# Altium schematic symbol library Altium_Lib.SchLib: 403 symbols (part 3 of 4) (continued)
## STM32F030C8T6_XX (continued)

## STM32F030K6T6
designator U?
IC MCU 32BIT 32KB FLASH 32LQFP; Manufacturer: STMicroelectronics; Oscillator Type: Internal; Data Converters: A/D 12x12b; Voltage - Supply (Vcc/Vdd): 2.4 V ~ 3.6 V; Peripherals: DMA, POR, PWM, WDT; RAM Size: 4K x 8; Program Memory Size: 32KB (32K x 8); Number of I/O: 26; Connectivity: I²C, SPI, UART/USART; Speed: 48MHz; Core Size: 32-Bit; Core Processor: ARM® Cortex®-M0; Supplier 1: Digi-Key; Supplier Device Package: 32-LQFP (7x7); Package / Case: 32-LQFP; Operating Temperature: -40°C ~ 85°C (TA); Program Memory Type: FLASH; EEPROM Size: -; Supplier: Digi-Key; RoHS: RoHS Compliant; Part Status: Active; Packaging: Tray; Category: Integrated Circuits (ICs); Manufacturer Part Number: STM32F030K6T6; ComponentLink1URL: http://www.st.com/content/ccc/resource/technical/document/datasheet/a4/5d/0b/0e/87/c4/4d/71/DM00088500.pdf/files/DM00088500.pdf/jcr:content/translations/en.DM00088500.pdf; ComponentLink1Description: http://www.st.com/content/ccc/resource/technical/document/datasheet/a4/5d/0b/0e/87/c4/4d/71/DM00088500.pdf/files/DM00088500.pdf/jcr:content/translations/en.DM00088500.pdf; Pricing: 1=1.48, 10=1.328, 100=1.0671, 500=0.87676, 1000=0.72645 (USD); Supplier Part Number: 497-14046-ND; Mounting Type: Surface Mount
footprint LQFP-32
pins: 1 VDD, 2 PF0-OSC_IN, 3 PF1-OSC_OUT, 4 NRST, 5 VDDA, 6 PA0, 7 PA1, 8 PA2, 9 PA3, 10 PA4, 11 PA5, 12 PA6, 13 PA7, 14 PB0, 15 PB1, 16 VSS, 17 VDD, 18 PA8, 19 PA9/USART1_TX, 20 PA10/USART1_RX, 21 PA11, 22 PA12, 23 PA13/SWDIO, 24 PA14/SWCLK, 25 PA15, 26 PB3, 27 PB4, 28 PB5, 29 PB6, 30 PB7, 31 BOOT0, 32 VSS

## STM32F072CB
designator U?, comment STM32F072CBT6
IC MCU 32BIT 128KB FLASH 48LQFP; Manufacturer: STMicroelectronics; Connectivity: CAN, HDMI-CEC, I²C, IrDA, LIN, SPI, UART/USART, USB; Core Processor: ARM® Cortex®-M0; Core Size: 32-Bit; Data Converters: A/D 10x12b, D/A 2x12b; Number of I/O: 37; Oscillator Type: Internal; Peripherals: DMA, I²S, POR, PWM, WDT; Program Memory Size: 128KB (128K x 8); RAM Size: 16K x 8; Speed: 48MHz; Voltage - Supply (Vcc/Vdd): 1.65 V ~ 3.6 V; Category: Integrated Circuits (ICs); EEPROM Size: -; Manufacturer Part Number: STM32F072CBT6; Operating Temperature: -40°C ~ 85°C (TA); Package / Case: 48-LQFP; Packaging: Tray; Part Status: Active; Program Memory Type: FLASH; RoHS: RoHS Compliant; Supplier: Digi-Key; Supplier Device Package: 48-LQFP (7x7); ComponentLink1URL: http://www.st.com/content/ccc/resource/technical/document/datasheet/cd/46/43/83/22/d3/40/c8/DM00090510.pdf/files/DM00090510.pdf/jcr:content/translations/en.DM00090510.pdf; ComponentLink1Description: http://www.st.com/content/ccc/resource/technical/document/datasheet/cd/46/43/83/22/d3/40/c8/DM00090510.pdf/files/DM00090510.pdf/jcr:content/translations/en.DM00090510.pdf; Pricing: 1=3.56, 10=3.196, 100=2.6189, 500=2.22938, 1000=1.8802 (USD); Supplier Part Number: 497-14645-ND; Mounting Type: Surface Mount
footprint LQFP-48-7x7 (hin QFP, 48-Leads, Body 7x7mm, Pitch 0.5mm, IPC Medium Density)
pins: 1 VBAT (power), 2 PC13 (io), 3 PC14/OSC32_IN (io), 4 PC15/OSC32_OUT (io), 5 PF0/OSC_IN (io), 6 PF1/OSC_OUT (io), 7 NRST (io), 8 VSSA (power), 9 VDDA (power), 10 PA0 (io), 11 PA1 (io), 12 PA2 (io), 13 PA3 (io), 14 PA4 (io), 15 PA5 (io), 16 PA6 (io), 17 PA7 (io), 18 PB0 (io), 19 PB1 (io), 20 PB2 (io), 21 PB10 (io), 22 PB11 (io), 23 VSS (power), 24 VDD (power), 25 PB12 (io), 26 PB13 (io), 27 PB14 (io), 28 PB15 (io), 29 PA8 (io), 30 PA9 (io), 31 PA10 (io), 32 PA11 (io), 33 PA12 (io), 34 PA13/SWDIO (io), 35 VSS (power), 36 VDDIO2 (power), 37 PA14/SWCLK (io), 38 PA15 (io), 39 PB3 (io), 40 PB4 (io), 41 PB5 (io), 42 PB6 (io), 43 PB7 (io), 44 BOOT0 (io), 45 PB8 (io), 46 PB9 (io), 47 VSS (power), 48 VDD (power)

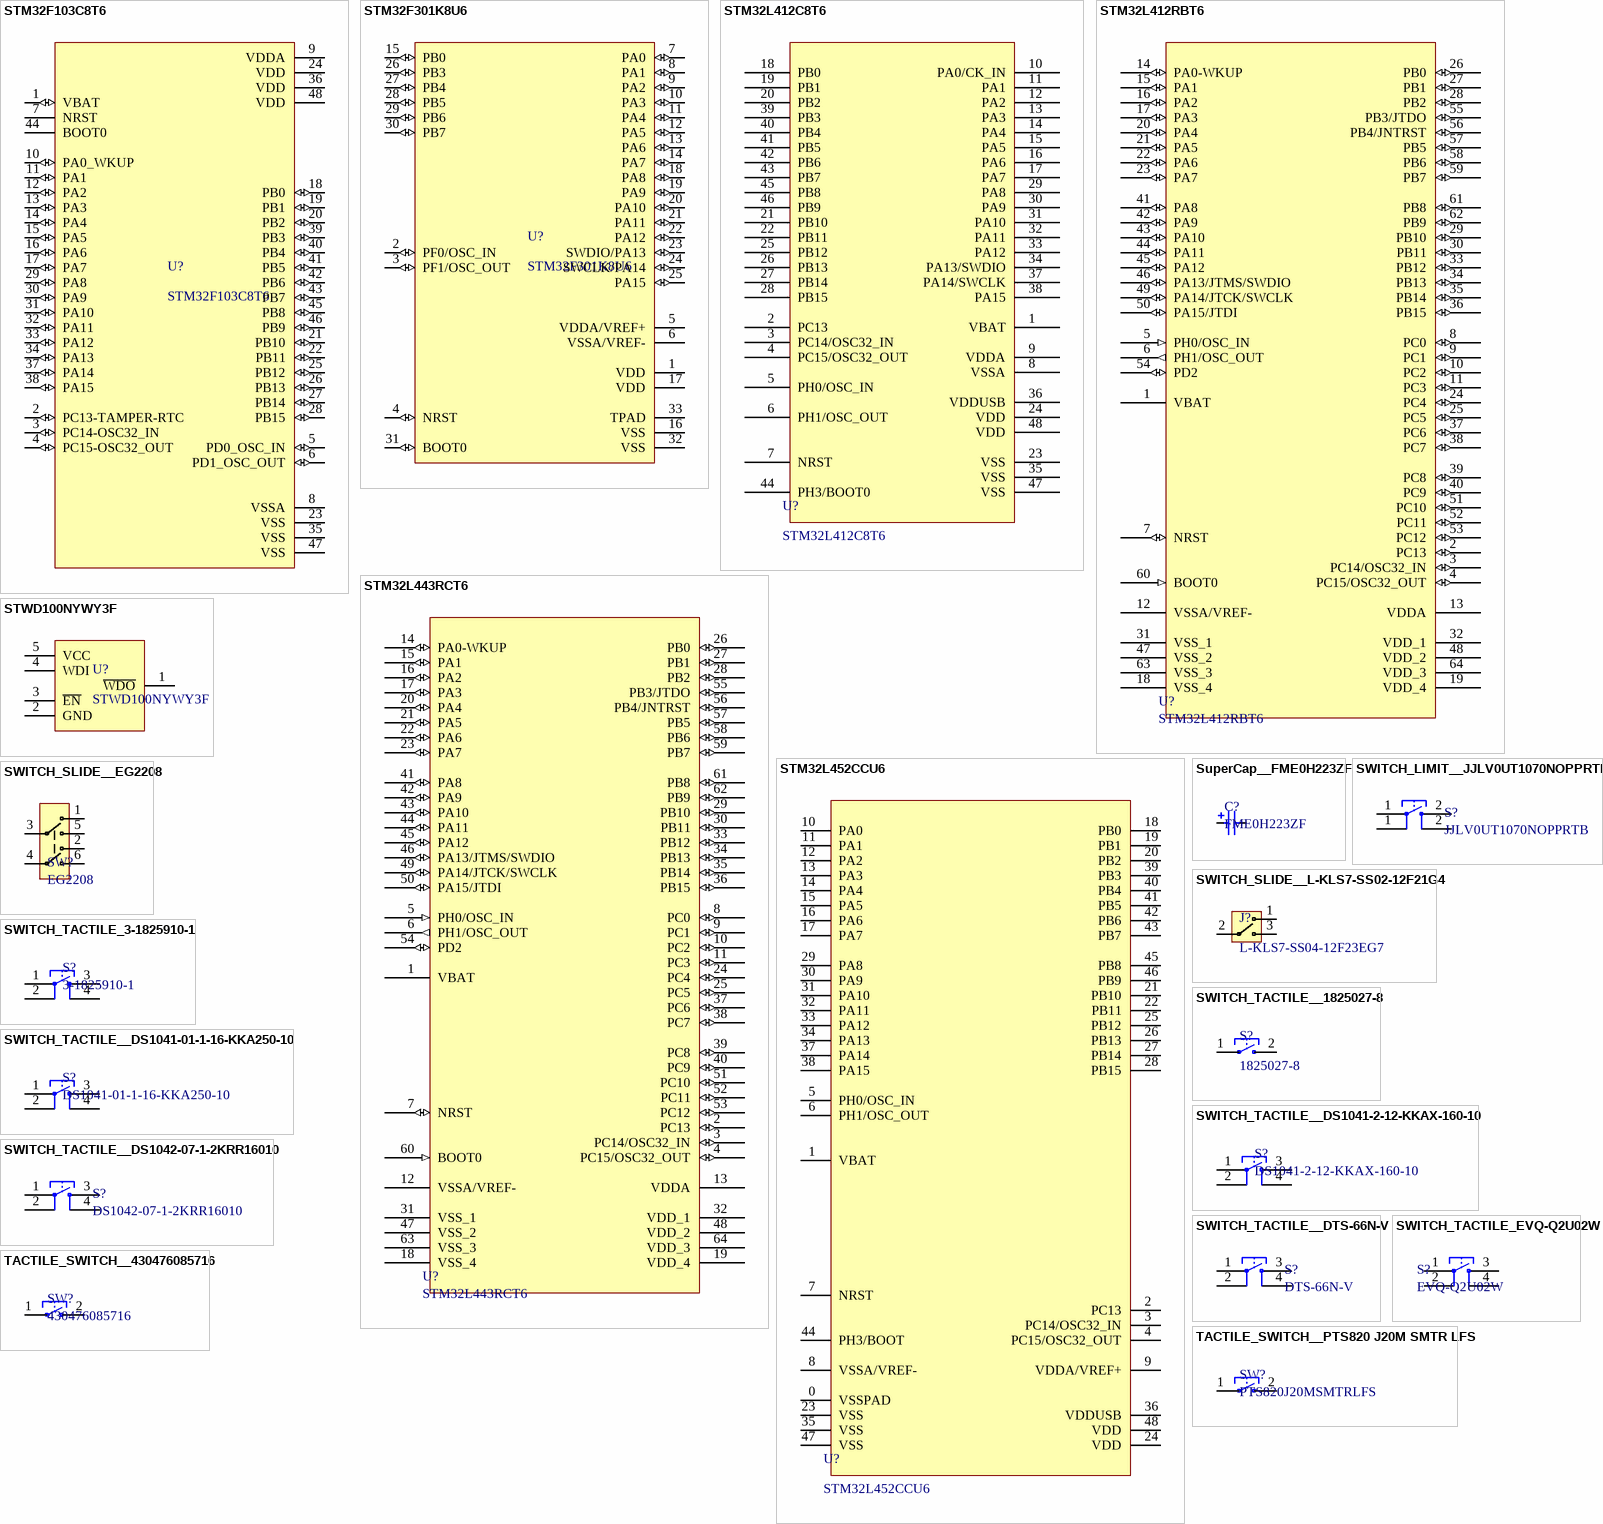
[diagram p9: symbols STM32F103C8T6 to TACTILE_SWITCH__PTS820 J20M SMTR LFS]

## STM32F103C8T6
designator U?
IC MCU 32-Bit 72MHz 64kB FLASH LQFP48; MF: STMicroelectronics; RAM Size: 20KB; Max Power Dissipation: 363mW; Interface: I2C,SPI,USB,CAN,IrDA,UART,USART,LIN; Number of I/Os: 37; Number of Timers/Counters: 4; Max Supply Voltage: 3.6V; Number of ADC Channels: 10; Min Supply Voltage: 2V; Oscillator Type: Internal; Number of Programmable I/O: 48; Data Bus Width: 32b; Number of Bits: 32; Watchdog Timer: Yes; Peripherals: POR,PWM,WDT,DMA,Temp Sensor,I2C; Core Architecture: ARM; Number of PWM Channels: 1; Number of SPI Channels: 2; Price: None; Package: LQFP-48 STMicroelectronics; Value: *; MP: STM32F103C8T6; Availability: Unavailable; Supplier 1: Digi-Key; Manufacturer: STMicroelectronics; Manufacturer Part Number: STM32F103C8T6; RoHS: Yes; Category: Microcontrollers; Pricing 1: 1=7,00000, 10=6,28800, 25=5,94440, 80=5,15175, 250=4,88756, 500=4,40320 (USD); Case/Package: LQFP; Number of Pins: 48; Min Operating Temperature: -40°C; Max Operating Temperature: 85°C; Frequency: 72MHz; Packaging: Tray; Package Quantity: 250; Density: 64KB; Memory Type: FLASH; Max Frequency: 72MHz; Memory Size: 64KB; Termination: SMD/SMT; Number of I2C Channels: 2; Address Bus Width: 32b; Length: 7mm; Width: 7.2mm; Height: 1.45mm; Radiation Hardening: No; Lead Free: Lead Free; REACH SVHC: No SVHC; ComponentLink1URL: https://datasheet.ciiva.com/15122/getdatasheetpartid-69880-15122076.pdf?src-supplier=Verical; ComponentLink1Description: https://datasheet.ciiva.com/15122/getdatasheetpartid-69880-15122076.pdf?src-supplier=Verical; ComponentLink2URL: https://datasheet.ciiva.com/26816/stm32f103c8t6-26816902.pdf?src-supplier=IIIC; ComponentLink2Description: https://datasheet.ciiva.com/26816/stm32f103c8t6-26816902.pdf?src-supplier=IIIC; ComponentLink3URL: https://datasheet.ciiva.com/16210/cd00161566-16210248.pdf?src-supplier=Future+Electronics; ComponentLink3Description: https://datasheet.ciiva.com/16210/cd00161566-16210248.pdf?src-supplier=Future+Electronics; ComponentLink4URL: https://datasheet.ciiva.com/14100/pustm-arm-microcont-stm32f103-en-14100508.pdf?src-supplier=Distrelec; ComponentLink4Description: https://datasheet.ciiva.com/14100/pustm-arm-microcont-stm32f103-en-14100508.pdf?src-supplier=Distrelec; ComponentLink5URL: https://datasheet.ciiva.com/8054/1730126-8054942.pdf?src-supplier=Element14; ComponentLink5Description: https://datasheet.ciiva.com/8054/1730126-8054942.pdf?src-supplier=Element14; ComponentLink6URL: https://datasheet.ciiva.com/48687/001075658-da-01-en-mcu-64kb-mem-stm32f103c8t6-lqfp-48-stm-48687589.pdf?src-supplier=Conrad; ComponentLink6Description: https://datasheet.ciiva.com/48687/001075658-da-01-en-mcu-64kb-mem-stm32f103c8t6-lqfp-48-stm-48687589.pdf?src-supplier=Conrad; Supplier Part Number 1: 497-6063-ND
footprint QFN48-(7mmX7mm) (QFN, 48-Leads, Body 7,1x7,1mm (max), Pitch 0,50mm, IPC Medium Density)
pins: 1 VBAT (io), 2 PC13-TAMPER-RTC (io), 3 PC14-OSC32_IN (io), 4 PC15-OSC32_OUT (io), 5 PD0_OSC_IN (io), 6 PD1_OSC_OUT (io), 7 NRST, 8 VSSA, 9 VDDA, 10 PA0_WKUP (io), 11 PA1 (io), 12 PA2 (io), 13 PA3 (io), 14 PA4 (io), 15 PA5 (io), 16 PA6 (io), 17 PA7 (io), 18 PB0 (io), 19 PB1 (io), 20 PB2 (io), 21 PB10 (io), 22 PB11 (io), 23 VSS, 24 VDD, 25 PB12 (io), 26 PB13 (io), 27 PB14 (io), 28 PB15 (io), 29 PA8 (io), 30 PA9 (io), 31 PA10 (io), 32 PA11 (io), 33 PA12 (io), 34 PA13 (io), 35 VSS, 36 VDD, 37 PA14 (io), 38 PA15 (io), 39 PB3 (io), 40 PB4 (io), 41 PB5 (io), 42 PB6 (io), 43 PB7 (io), 44 BOOT0, 45 PB8 (io), 46 PB9 (io), 47 VSS, 48 VDD

## STM32F301K8U6
designator U?
ARM Microcontrollers - MCU Mainstream Mixed signals MCUs ARM Cortex-M4 core with DSP and FPU, 64 Kbytes Flash, 72 MHz CPU, 12-bit ADC 5 MSPS, Comparator, Op-Amp; Manufacturer: STMicroelectronics; Processor Series: ARM Cortex M; Supplier 1: Mouser; Manufacturer Part Number: STM32F301K8U6; RoHS: RoHS Compliant; Category: ARM Microcontrollers - MCU; Stock 1: 2435; Pricing 1: 1=2.89, 10=2.46, 100=1.97, 500=1.72, 1000=1.43, 2500=1.33, 5000=1.28 (USD); Series: STM32F301K8; Brand: STMicroelectronics; Standard Pack Qty: 2940; Tradename: STM32; RoHS - Mouser: Y; Minimum Order Quantity: 1; Reeling: False; ComponentLink1URL: https://www.mouser.com/datasheet/2/389/stm32f301c6-956213.pdf; ComponentLink1Description: https://www.mouser.com/datasheet/2/389/stm32f301c6-956213.pdf; Supplier Part Number 1: 511-STM32F301K8U6
footprint UFQFPN32__50P500X500X60-33N
pins: 1 VDD (power), 2 PF0/OSC_IN (io), 3 PF1/OSC_OUT (io), 4 NRST (io), 5 VDDA/VREF+ (power), 6 VSSA/VREF- (power), 7 PA0 (io), 8 PA1 (io), 9 PA2 (io), 10 PA3 (io), 11 PA4 (io), 12 PA5 (io), 13 PA6 (io), 14 PA7 (io), 15 PB0 (io), 16 VSS (power), 17 VDD (power), 18 PA8 (io), 19 PA9 (io), 20 PA10 (io), 21 PA11 (io), 22 PA12 (io), 23 SWDIO/PA13 (io), 24 SWCLK/PA14 (io), 25 PA15 (io), 26 PB3 (io), 27 PB4 (io), 28 PB5 (io), 29 PB6 (io), 30 PB7 (io), 31 BOOT0 (io), 32 VSS (power), 33 TPAD (power)

## STM32L412C8T6
designator U?
ARM Microcontrollers - MCU 16/32-BITS MICROS; Manufacturer: STMicroelectronics; Program Memory Type: Flash; Data RAM Size: 40 kB; Data RAM Type: SRAM; Interface Type: CAN, I2C, SPI, UART, USART, USB; Program Memory Size: 64 kB; ADC Resolution: 12 bit; Analog Supply Voltage: 1.62 V to 3.6 V; Core: ARM Cortex M4; Data Bus Width: 32 bit; Maximum Clock Frequency: 80 MHz; Number of ADC Channels: 12 Channel; Operating Supply Voltage: 1.71 V to 3.6 V; Supply Voltage - Max: 3.6 V; Supply Voltage - Min: 1.71 V; Watchdog Timers: Watchdog Timer, Windowed; Product Status: New Product; Supplier 1: Mouser; Manufacturer Part Number: STM32L412C8T6; RoHS: RoHS Compliant; Category: ARM Microcontrollers - MCU; Stock 1: 1088; Pricing 1: 1=3.59, 10=3.05, 100=2.64, 250=2.50, 500=2.25, 1000=2.00, 2500=1.80, 5000=1.73 (USD); Package / Case: LQFP-48; Product: MCU+FPU; Series: STM32L412C8; Brand: STMicroelectronics; Mounting Style: SMD/SMT; Maximum Operating Temperature: + 85 C; Minimum Operating Temperature: - 40 C; Moisture Sensitive: Yes; Product Type: ARM Microcontrollers - MCU; Standard Pack Qty: 1500; Subcategory: Microcontrollers - MCU; Tradename: ARM; RoHS - Mouser: Y; Minimum Order Quantity: 1; Reeling: False; ComponentLink1URL: https://www.mouser.com/datasheet/2/389/stm32l412cb-1831850.pdf; ComponentLink1Description: https://www.mouser.com/datasheet/2/389/stm32l412cb-1831850.pdf; Supplier Part Number 1: 511-STM32L412C8T6
footprint LQFP-48-7x7 (hin QFP, 48-Leads, Body 7x7mm, Pitch 0.5mm, IPC Medium Density)
pins: 1 VBAT, 2 PC13, 3 PC14/OSC32_IN, 4 PC15/OSC32_OUT, 5 PH0/OSC_IN, 6 PH1/OSC_OUT, 7 NRST, 8 VSSA, 9 VDDA, 10 PA0/CK_IN, 11 PA1, 12 PA2, 13 PA3, 14 PA4, 15 PA5, 16 PA6, 17 PA7, 18 PB0, 19 PB1, 20 PB2, 21 PB10, 22 PB11, 23 VSS, 24 VDD, 25 PB12, 26 PB13, 27 PB14, 28 PB15, 29 PA8, 30 PA9, 31 PA10, 32 PA11, 33 PA12, 34 PA13/SWDIO, 35 VSS, 36 VDDUSB, 37 PA14/SWCLK, 38 PA15, 39 PB3, 40 PB4, 41 PB5, 42 PB6, 43 PB7, 44 PH3/BOOT0, 45 PB8, 46 PB9, 47 VSS, 48 VDD

## STM32L412RBT6
designator U?
Ultra-low-power with FPU Arm Cortex-M4 MCU 80 MHz with 128-Kbyte of Flash memory, USB; Manufacturer: STMicroelectronics; Supplier 1: Avnet; Manufacturer Part Number: STM32L412RBT6; Stock 1: 0; Pricing 1: 960=2.3301, 1920=2.2954, 3840=2.2606, 5760=2.2432, 7680=2.2171, 9600=2.1736, 96000=2.1389 (USD); RoHS Compliant: Yes; ComponentLink1URL: http://www.farnell.com/datasheets/2710915.pdf?src-supplier=Farnell; ComponentLink1Description: http://www.farnell.com/datasheets/2710915.pdf?src-supplier=Farnell; ComponentLink2URL: https://www.st.com/resource/en/datasheet/stm32l412kb.pdf?src-supplier=Digi-Key; ComponentLink2Description: https://www.st.com/resource/en/datasheet/stm32l412kb.pdf?src-supplier=Digi-Key; ComponentLink3URL: http://www.farnell.com/datasheets/2710915.pdf?src-supplier=Newark; ComponentLink3Description: http://www.farnell.com/datasheets/2710915.pdf?src-supplier=Newark; Supplier Part Number 1: STM32L412RBT6
footprint LQFP-64_N
pins: 1 VBAT (power), 2 PC13 (io), 3 PC14/OSC32_IN (io), 4 PC15/OSC32_OUT (io), 5 PH0/OSC_IN (in), 6 PH1/OSC_OUT (out), 7 NRST (io), 8 PC0 (io), 9 PC1 (io), 10 PC2 (io), 11 PC3 (io), 12 VSSA/VREF- (power), 13 VDDA (power), 14 PA0-WKUP (io), 15 PA1 (io), 16 PA2 (io), 17 PA3 (io), 18 VSS_4 (power), 19 VDD_4 (power), 20 PA4 (io), 21 PA5 (io), 22 PA6 (io), 23 PA7 (io), 24 PC4 (io), 25 PC5 (io), 26 PB0 (io), 27 PB1 (io), 28 PB2 (io), 29 PB10 (io), 30 PB11 (io), 31 VSS_1 (power), 32 VDD_1 (power), 33 PB12 (io), 34 PB13 (io), 35 PB14 (io), 36 PB15 (io), 37 PC6 (io), 38 PC7 (io), 39 PC8 (io), 40 PC9 (io), 41 PA8 (io), 42 PA9 (io), 43 PA10 (io), 44 PA11 (io), 45 PA12 (io), 46 PA13/JTMS/SWDIO (io), 47 VSS_2 (power), 48 VDD_2 (power), 49 PA14/JTCK/SWCLK (io), 50 PA15/JTDI (io), 51 PC10 (io), 52 PC11 (io), 53 PC12 (io), 54 PD2 (io), 55 PB3/JTDO (io), 56 PB4/JNTRST (io), 57 PB5 (io), 58 PB6 (io), 59 PB7 (io), 60 BOOT0 (in), 61 PB8 (io), 62 PB9 (io), 63 VSS_3 (power), 64 VDD_3 (power)

## STM32L443RCT6
designator U?
IC MCU 32BIT 256KB FLASH 64LQFP; Manufacturer: STMicroelectronics; Program Memory Size: 256KB (256K x 8); Core Size: 32-Bit; RAM Size: 64K x 8; Connectivity: CANbus, I²C, IrDA, LINbus, MMC/SD, QSPI, SAI, SPI, SWPMI, UART/USART, USB; Data Converters: A/D 16x12b, D/A 2x12b; Voltage - Supply (Vcc/Vdd): 1.71 V ~ 3.6 V; Peripherals: Brown-out Detect/Reset, DMA, LCD, PWM, WDT; Oscillator Type: Internal; Core Processor: ARM® Cortex®-M4; Speed: 80MHz; Program Memory Type: FLASH; RoHS: RoHS Compliant; Packaging: Tray; Manufacturer Part Number: STM32L443RCT6; Supplier: Digi-Key; Category: Integrated Circuits (ICs); Package / Case: 64-LQFP; Supplier Device Package: 64-LQFP (10x10); Part Status: Active; Operating Temperature: -40°C ~ 85°C (TA); EEPROM Size: -; ComponentLink1URL: http://www.st.com/content/ccc/resource/technical/document/datasheet/01/76/9c/b5/c7/d9/40/6c/DM00254865.pdf/files/DM00254865.pdf/jcr:content/translations/en.DM00254865.pdf; ComponentLink1Description: http://www.st.com/content/ccc/resource/technical/document/datasheet/01/76/9c/b5/c7/d9/40/6c/DM00254865.pdf/files/DM00254865.pdf/jcr:content/translations/en.DM00254865.pdf; Pricing: 1=6.49, 10=5.826, 100=4.7736, 960=4.06368, 1920=3.4272 (USD); Supplier Part Number: 497-16589-ND
footprint LQFP-64_N
pins: 1 VBAT (power), 2 PC13 (io), 3 PC14/OSC32_IN (io), 4 PC15/OSC32_OUT (io), 5 PH0/OSC_IN (in), 6 PH1/OSC_OUT (out), 7 NRST (io), 8 PC0 (io), 9 PC1 (io), 10 PC2 (io), 11 PC3 (io), 12 VSSA/VREF- (power), 13 VDDA (power), 14 PA0-WKUP (io), 15 PA1 (io), 16 PA2 (io), 17 PA3 (io), 18 VSS_4 (power), 19 VDD_4 (power), 20 PA4 (io), 21 PA5 (io), 22 PA6 (io), 23 PA7 (io), 24 PC4 (io), 25 PC5 (io), 26 PB0 (io), 27 PB1 (io), 28 PB2 (io), 29 PB10 (io), 30 PB11 (io), 31 VSS_1 (power), 32 VDD_1 (power), 33 PB12 (io), 34 PB13 (io), 35 PB14 (io), 36 PB15 (io), 37 PC6 (io), 38 PC7 (io), 39 PC8 (io), 40 PC9 (io), 41 PA8 (io), 42 PA9 (io), 43 PA10 (io), 44 PA11 (io), 45 PA12 (io), 46 PA13/JTMS/SWDIO (io), 47 VSS_2 (power), 48 VDD_2 (power), 49 PA14/JTCK/SWCLK (io), 50 PA15/JTDI (io), 51 PC10 (io), 52 PC11 (io), 53 PC12 (io), 54 PD2 (io), 55 PB3/JTDO (io), 56 PB4/JNTRST (io), 57 PB5 (io), 58 PB6 (io), 59 PB7 (io), 60 BOOT0 (in), 61 PB8 (io), 62 PB9 (io), 63 VSS_3 (power), 64 VDD_3 (power)

## STM32L452CCU6
designator U?
Ultra-low-power with FPU Arm Cortex-M4 MCU 80 MHz with 256 Kbytes Flash, USB Device, DFSDM; Manufacturer: STMicroelectronics; Interface: I2C,SPI,USB,IrDA,UART,USART; Peripherals: Brown-out Detect/Reset,PWM,WDT,DMA; Frequency: 80MHz; Number of I/Os: 38; Memory Size: 256KB; Oscillator Type: Internal; Supplier 1: Avnet; Manufacturer Part Number: STM32L452CCU6; Stock 1: 0; Pricing 1: 1560=3.3165, 3120=3.2072, 6240=3.1586, 9360=3.1343, 12480=3.0979, 15600=3.0371, 156000=2.9885 (USD); Case/Package: UFQFPN; Min Operating Temperature: -40°C; Max Operating Temperature: 85°C; Memory Type: FLASH; Packaging: Tray; Core Architecture: ARM; ComponentLink1URL: http://www.farnell.com/datasheets/2605257.pdf?src-supplier=Farnell; ComponentLink1Description: http://www.farnell.com/datasheets/2605257.pdf?src-supplier=Farnell; ComponentLink2URL: http://www.st.com/content/ccc/resource/technical/document/datasheet/group3/fc/c2/8d/b7/99/d8/42/9e/DM00340549/files/DM00340549.pdf/jcr:content/translations/en.DM00340549.pdf?src-supplier=Digi-Key; ComponentLink2Description: http://www.st.com/content/ccc/resource/technical/document/datasheet/group3/fc/c2/8d/b7/99/d8/42/9e/DM00340549/files/DM00340549.pdf/jcr:content/translations/en.DM00340549.pdf?src-supplier=Digi-Key; ComponentLink3URL: http://www.farnell.com/datasheets/2605257.pdf?src-supplier=Newark; ComponentLink3Description: http://www.farnell.com/datasheets/2605257.pdf?src-supplier=Newark; Supplier Part Number 1: STM32L452CCU6
footprint UFQFPN48
pins: 0 VSSPAD, 1 VBAT, 2 PC13, 3 PC14/OSC32_IN, 4 PC15/OSC32_OUT, 5 PH0/OSC_IN, 6 PH1/OSC_OUT, 7 NRST, 8 VSSA/VREF-, 9 VDDA/VREF+, 10 PA0, 11 PA1, 12 PA2, 13 PA3, 14 PA4, 15 PA5, 16 PA6, 17 PA7, 18 PB0, 19 PB1, 20 PB2, 21 PB10, 22 PB11, 23 VSS, 24 VDD, 25 PB12, 26 PB13, 27 PB14, 28 PB15, 29 PA8, 30 PA9, 31 PA10, 32 PA11, 33 PA12, 34 PA13, 35 VSS, 36 VDDUSB, 37 PA14, 38 PA15, 39 PB3, 40 PB4, 41 PB5, 42 PB6, 43 PB7, 44 PH3/BOOT, 45 PB8, 46 PB9, 47 VSS, 48 VDD

## STWD100NYWY3F
designator U?
IC WATCHDOG TIME CIRCUIT SOT23-5; Manufacturer: STMicroelectronics; Detailed Description: Supervisor Open Drain or Open Collector 1 Channel SOT-23-5; Categories: Integrated Circuits (ICs)   PMIC - Supervisors; Number of Voltages Monitored: 1; Output: Open Drain or Open Collector; Reset: Active Low; Reset Timeout: 1.12s Minimum; Manufacturer Part Number: STWD100NYWY3F; Digi-Key Part Number: 497-10058-2-ND; ComponentLink1Description: https://www.st.com/content/ccc/resource/technical/document/datasheet/06/6a/b3/83/9a/c7/4f/22/CD00176077.pdf/files/CD00176077.pdf/jcr:content/translations/en.CD00176077.pdf; Series: Tape & Reel (TR); Type: Watchdog Circuit; Operating Temperature: -40°C ~ 125°C (TA); Mounting Type: Surface Mount; Package / Case: SC-74A, SOT-753; Supplier Device Package: SOT-23-5; Base Part Number: STWD100
footprint SOT23-5 (SOT-23/SC-74A; 5 Leads; Body 3 x 3 mm, inc. leads (LxW max))
pins: 1 ~{WDO}, 2 GND, 3 ~{EN}, 4 WDI, 5 VCC

## SuperCap__FME0H223ZF
designator C?, comment FME0H223ZF
CAP 22MF -20% +80% 5.5V T/H; Manufacturer: KEMET; Tolerance: 80%; ESR (Equivalent Series Resistance): 40R; Life (Hours): 1000Hour; Supplier 1: Avnet; Manufacturer Part Number: FME0H223ZF; Stock 1: 0; Pricing 1: 1=1.553, 10=1.498, 30=1.4552, 50=1.4231, 100=1.3696, 250=1.3375, 500=1.22 (USD); Mount: Through Hole; Case/Package: Radial; Min Operating Temperature: -25°C; Max Operating Temperature: 70°C; Packaging: Bulk; Capacitance: 22mF; Voltage Rating: 5.5V; Termination: PC Pins; Length: 0.413inch; Width: 0.197inch; Lead Pitch: 0.197inch; Height - Seated (Max): 0.472inch; RoHS Compliant: Yes; ComponentLink1URL: https://api.kemet.com/component-edge/download/datasheet/FME0H223ZF.pdf?src-supplier=Digi-Key; ComponentLink1Description: https://api.kemet.com/component-edge/download/datasheet/FME0H223ZF.pdf?src-supplier=Digi-Key; Supplier Part Number 1: FME0H223ZF
footprint SuperCap__FME0H223ZF
pins: 1, 2

## SWITCH_LIMIT__JJLV0UT1070NOPPRTB
designator S?, comment JJLV0UT1070NOPPRTB
Switch Detector N.O. SPST Plunger PC Pins 0.005A 5VDC Thru-Hole Tube; Manufacturer: TE Connectivity; Actuator Material: Thermoplastic; Mechanical Life: 50000Cycles; Contact Current Rating: 5mA; Switch Function: Off-Mom; Voltage Rating (DC): 5V; Operating Force: 35gf; Supplier 1: Avnet; Manufacturer Part Number: JJLV0UT1070NOPPRTB; Stock 1: 0; Pricing 1: 700=0.4664, 1400=0.4502, 2800=0.4348, 4200=0.4194, 5600=0.404, 7000=0.3747, 70000=0.3132 (USD); Mount: Through Hole; Contact Material: Stainless Steel; Contact Plating: Silver; Min Operating Temperature: -20°C; Max Operating Temperature: 70°C; Type: Switch; Throw Configuration: SPST; Packaging: Rail/Tube; Current Rating: 5mA; Termination: PC Pin; Electrical Life: 50000Cycles; RoHS Compliant: Yes; ComponentLink1URL: https://www.te.com/commerce/DocumentDelivery/DDEController?Action=srchrtrv&amp;DocNm=2331396-1&amp;DocType=DS&amp;DocLang=English&src-supplier=Digi-Key; ComponentLink1Description: https://www.te.com/commerce/DocumentDelivery/DDEController?Action=srchrtrv&amp;DocNm=2331396-1&amp;DocType=DS&amp;DocLang=English&src-supplier=Digi-Key; Supplier Part Number 1: 2331396-1
footprint SWITCH_LIMIT_ JJLV0UT1070NOPPRTB (SWITCH DETECTOR SPST-NO 5MA 5V)
pins: 1, 1, 2, 2

## SWITCH_SLIDE__EG2208
designator SW?, comment EG2208
E-SWITCH - EG2208 - SWITCH, SLIDE, DPDT, 200mA, 30V, PCB; Contact Voltage DC Max: 30; Contact Current Max: 200; Switch Mounting: Through Hole; Contact Voltage AC Max: -; Contact Configuration: DPDT; Manufacturer Part Number: EG2208; Supplier: Newark; RoHS: YES; Manufacturer: E-SWITCH; Product Range: -; Switch Operation: -; ComponentLink1URL: http://spec.e-switch.com/P-J/P040110C.pdf; ComponentLink1Description: http://spec.e-switch.com/P-J/P040110C.pdf; Supplier Part Number: 15N7339
footprint SWITCH_SLIDE__EG2208
pins: 1, 2, 3, 4, 5, 6

## SWITCH_SLIDE__L-KLS7-SS02-12F21G4
designator J?, comment L-KLS7-SS04-12F23EG7
SWITCH SLIDE 1P2T 11.5MM 90C 2; Manufacturer: KLS ELECTRONIC; Manufacturer Part Number: L-KLS7-SS04-12F23EG7
footprint SWITCH_SLIDE__L-KLS7-SS04-12F23EG7
pins: 1, 2, 3

## SWITCH_TACTILE_3-1825910-1
designator S?, comment 3-1825910-1
SWITCH TACTILE SPST-NO 0.05A 24V; Manufacturer: TE Connectivity ALCOSWITCH Switches; Actuator Orientation: Top Actuated; Illumination: Non-Illuminated; Actuator Material: Polyamide (PA66), Nylon 6/6; Switch Function: Off-Mom; Actuator Height off PCB, Vertical: 17.00mm; Operating Force: 160gf; Outline: 6.00mm x 6.00mm; Actuator Type: Standard; Contact Rating @ Voltage: 0.05A @ 24VDC; Switch Travel: 0.25mm; Mechanical Life: 100,000 Cycles; Ingress Protection: -; Operating Temperature: -35°C ~ 85°C; Actuator Length, Right Angle: -; Supplier: Digi-Key; RoHS: RoHS Compliant; Circuit: SPST-NO; Category: Switches; Illumination Voltage (Nominal): -; Illumination Type, Color: -; Part Status: Active; Packaging: Bulk; Mounting Type: Through Hole; Termination Style: PC Pin; Manufacturer Part Number: 3-1825910-1; Features: -; ComponentLink1URL: http://www.te.com/commerce/DocumentDelivery/DDEController?Action=srchrtrv&DocNm=1825910&DocType=Customer+Drawing&DocLang=English; ComponentLink1Description: http://www.te.com/commerce/DocumentDelivery/DDEController?Action=srchrtrv&DocNm=1825910&DocType=Customer+Drawing&DocLang=English; Pricing: 1=0.17, 10=0.16, 25=0.1544, 50=0.149, 100=0.1407, 250=0.13244, 500=0.1269, 1000=0.09656, 5000=0.08001 (USD); Stock: 38029; Supplier Part Number: 450-1643-ND
footprint Tact_THD_6x6_17mm
pins: 1, 2, 3, 4

## SWITCH_TACTILE__1825027-8
designator S?, comment 1825027-8
SWITCH TACTILE SPST-NO 0.05A 24V; Manufacturer: TE Connectivity / P&B; Actuator: Round; Contact Form: SPST; Current Rating: 50 mA; Switch Function: OFF - (ON); Voltage Rating DC: 24 VDC; Illuminated: Non-Illuminated; Supplier 1: Mouser; Manufacturer Part Number: 1825027-8; RoHS: RoHS Compliant; Category: Tactile Switches; Stock 1: 17021; Pricing 1: 1=0.160, 10=0.154, 25=0.148, 50=0.140, 100=0.131, 250=0.126, 500=0.106, 1000=0.097, 2500=0.081 (USD); Contact Plating: Silver; Height: 7 mm; Illumination Color: -; Series: FSMRAJ; Termination Style: Solder Pin; Voltage Rating AC: -; Brand: TE Connectivity / P&B; Lamp Type: -; Mounting Style: Through Hole; Product Type: Tactile Switches; Standard Pack Qty: 1000; Subcategory: Switches; RoHS - Mouser: Y; Minimum Order Quantity: 1; Reeling: False; Supplier Part Number 1: 506-1825027-8
footprint 1825027-8 (B3F-31XX)
pins: 1, 2

## SWITCH_TACTILE__DS1041-01-1-16-KKA250-10
designator S?, comment DS1041-01-1-16-KKA250-10
SWITCH TACT 6x6MM 11MM 250gf CONNFLY; Outline: 6.00mm x 6.00mm; Manufacturer: CONNFLY; Manufacturer Part Number: DS1041-01-1-16-KKA250-10; Actuator Height off PCB, Vertical: 11mm
footprint Tact_THD_6x6_11mm
pins: 1, 2, 3, 4

## SWITCH_TACTILE__DS1041-2-12-KKAX-160-10
designator S?, comment DS1041-2-12-KKAX-160-10
SWITCH TACT 12x12MM 17MM 160gf BLACK CONNFLY; Outline: 12.00mm x 12.00mm; Manufacturer: CONNFLY; Manufacturer Part Number: DS1041-2-12-KKAX-160-10; Actuator Height off PCB, Vertical: 17mm
footprint Tact_THD_12x12_17mm
pins: 1, 2, 3, 4

## SWITCH_TACTILE__DS1042-07-1-2KRR16010
designator S?, comment DS1042-07-1-2KRR16010
SWITCH TACT 6.2x6.2MM 3.5MM 160gf SMD; Manufacturer: CONNFLY; Outline: 6.20x6.20; Actuator Height off PCB, Vertical: 3.50mm; Manufacturer Part Number: DS1042-07-1-2KRR16010
footprint Tact_THD_6.2x6.2__3.50MM
pins: 1, 2, 3, 4

## SWITCH_TACTILE__DTS-66N-V
designator S?, comment DTS-66N-V
Tactile Switches 6x6mm 13mm 160gf BROWN; Manufacturer: Diptronics; Outline: 6.20x6.20; Manufacturer Part Number: DTS-66N-V; Actuator Height off PCB, Vertical: 13 mm
footprint Tact_THD_6x6_13mm
pins: 1, 2, 3, 4

## SWITCH_TACTILE_EVQ-Q2U02W
designator S?, comment EVQ-Q2U02W
SWITCH TACTILE SPST-NO 0.02A 15V; Manufacturer: Panasonic Electronic Components; Actuator Orientation: Top Actuated; Operating Force: 260gf; Mechanical Life: 200,000 Cycles; Switch Function: Off-Mom; Illumination: Non-Illuminated; Outline: 6.60mm x 6.00mm; Actuator Type: Standard; Contact Rating @ Voltage: 0.02A @ 15VDC; Switch Travel: 0.25mm; Actuator Height off PCB, Vertical: 2.50mm; Actuator Length, Right Angle: -; Features: -; Manufacturer Part Number: EVQ-Q2U02W; RoHS: RoHS Compliant; Circuit: SPST-NO; Part Status: Active; Packaging: Digi-Reel®; Ingress Protection: -; Operating Temperature: -40°C ~ 85°C; Mounting Type: Surface Mount; Category: Switches; Illumination Type, Color: -; Termination Style: J Lead; Illumination Voltage (Nominal): -; Actuator Material: -; Supplier: Digi-Key; ComponentLink1URL: https://industrial.panasonic.com/ac/cdn/e/control/switch/light-touch/catalog/sw_lt_eng_6s_th.pdf; ComponentLink1Description: https://industrial.panasonic.com/ac/cdn/e/control/switch/light-touch/catalog/sw_lt_eng_6s_th.pdf; Pricing: 1=0.3, 10=0.286, 25=0.2752, 50=0.2652, 100=0.2549, 250=0.23452, 500=0.20394, 1000=0.17335 (USD); Supplier Part Number: P12954SDKR-ND
footprint Tact_THD_6.2x6.2
pins: 1, 2, 3, 4

## TACTILE_SWITCH__430476085716
designator SW?, comment 430476085716
SWITCH TACTILE SPST-NO 0.05A 12V; Manufacturer: Wurth Electronics Inc.; Actuator Type: Standard; Actuator Orientation: Top Actuated; Contact Rating @ Voltage: 0.05A @ 12VDC; Switch Function: Off-Mom; Actuator Height off PCB, Vertical: 8.50mm; Outline: 12.00mm x 12.00mm; Illumination: Non-Illuminated; Operating Force: 160gf; Actuator Material: Liquid Crystal Polymer (LCP); Mechanical Life: 500,000 Cycles; Switch Travel: 0.30mm; Actuator Length, Right Angle: -; Mounting Type: Through Hole; Circuit: SPST-NO; Supplier: Digi-Key; Part Status: Active; Category: Switches; Packaging: Bulk; Manufacturer Part Number: 430476085716; RoHS: RoHS Compliant; Termination Style: PC Pin; Illumination Voltage (Nominal): -; Illumination Type, Color: -; Operating Temperature: -40°C ~ 85°C; Features: -; Ingress Protection: -; ComponentLink1URL: http://katalog.we-online.de/em/datasheet/430476085716.pdf; ComponentLink1Description: http://katalog.we-online.de/em/datasheet/430476085716.pdf; Supplier Part Number: 430476085716-ND
footprint TACTILE_SWITCH__430476085716
pins: 1, 2

## TACTILE_SWITCH__PTS820 J20M SMTR LFS
designator SW?, comment PTS820J20MSMTRLFS
Switch Tactile N.O. SPST Round Button J-Bend 0.05A 12VDC 1.57N SMD T/R; Manufacturer: ITT C&K; Mechanical Life: 200000Cycles; Operating Force: 160gf; Current Rating: 50mA; Voltage Rating (DC): 12V; Illumination Type: Non-Illuminated; Switch Travel: 0.2mm; Switch Function: Off-Mom; Actuator Type: Standard; Supplier 1: Avnet; Manufacturer Part Number: PTS820J20MSMTRLFS; Stock 1: 0; Pricing 1: 2500=0.3899, 5000=0.3776, 10000=0.3585, 15000=0.3489, 20000=0.3322, 25000=0.3227, 250000=0.1769 (USD); Mount: Surface Mount; Case/Package: SMD/SMT; Color: Silver; Contact Plating: Silver; Min Operating Temperature: -40°C; Max Operating Temperature: 85°C; Packaging: Tape and Reel; Throw Configuration: SPST; Package Quantity: 2500; RoHS Compliant: Yes; Lead Free: Lead Free; ComponentLink1URL: https://www.ckswitches.com/media/1474/pts820.pdf?src-supplier=Digi-Key; ComponentLink1Description: https://www.ckswitches.com/media/1474/pts820.pdf?src-supplier=Digi-Key; Supplier Part Number 1: Y97MT26B2MBFP
footprint TACTILE_SWITCH__PTS820J25MSMTRLFS
pins: 1, 2

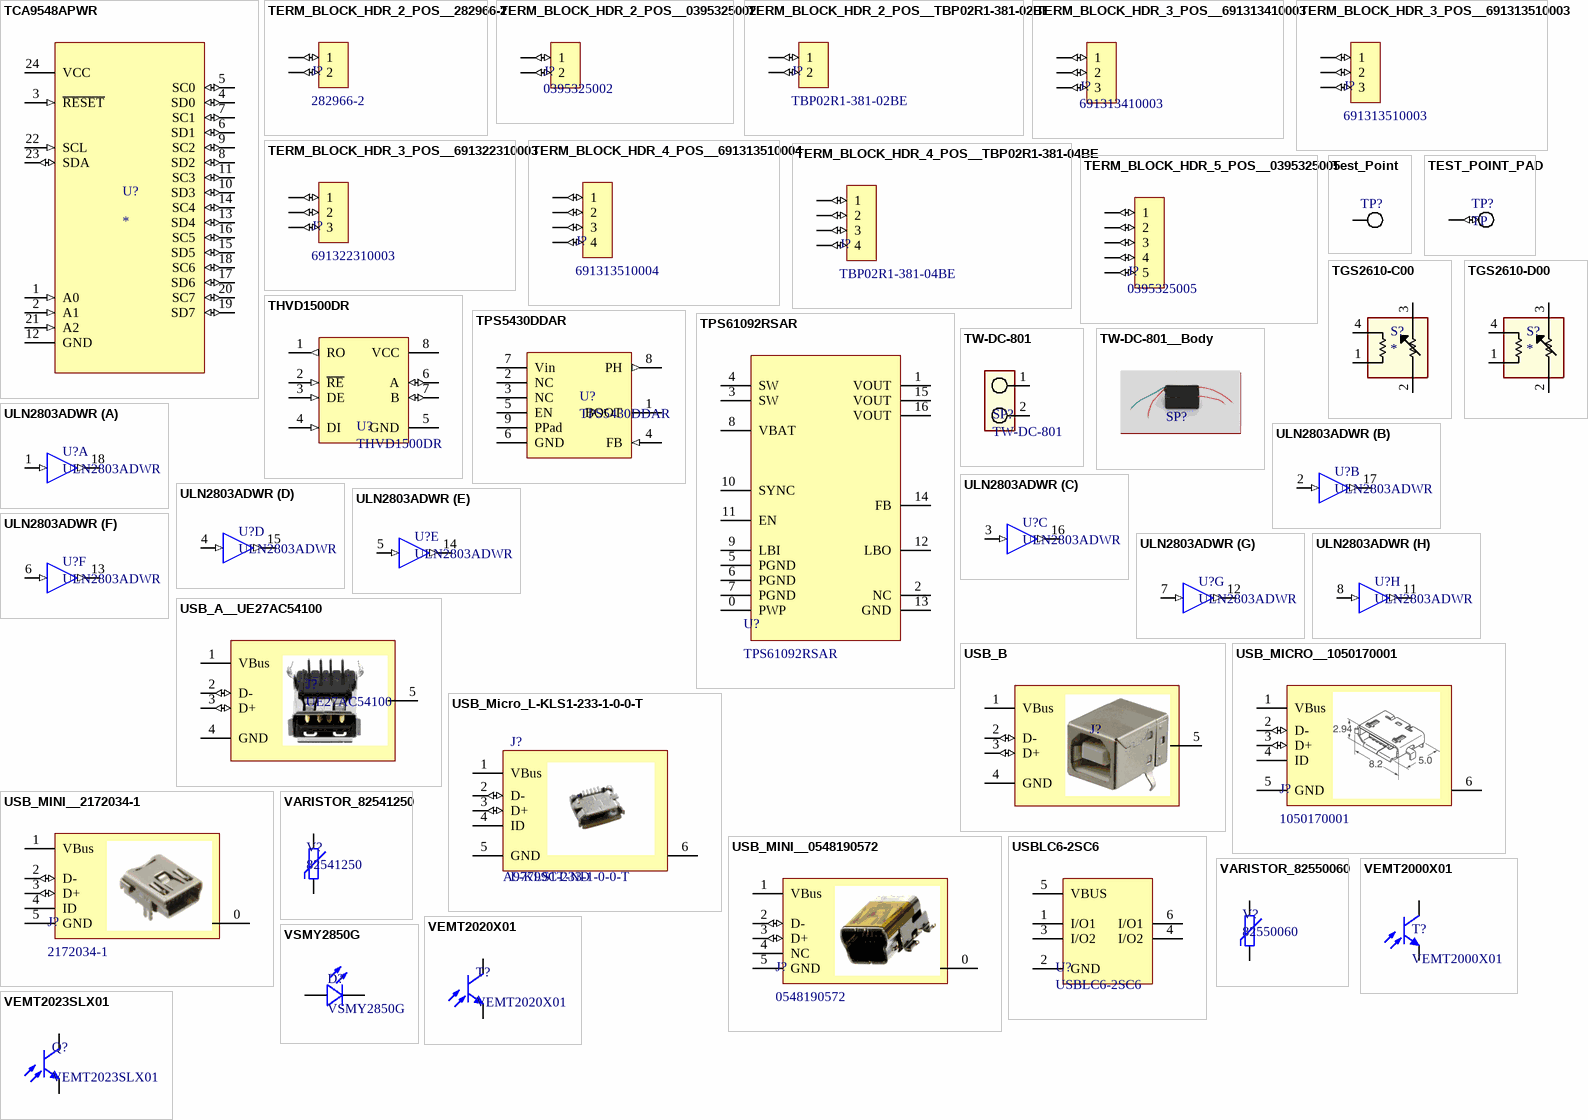
[diagram p10: symbols TCA9548APWR to VSMY2850G]